# Altium footprint library IC.PcbLib: 220 footprints (part 5 of 14)
Each footprint in its own frame and in the unit in brackets; x right, y up, seen from the top. Pads: shape width x height; smd on the part's side, far side on the other; paste and mask are expansions set on the pad; w line width, h text height; cw(c..) or ccw(c..) is an arc to the next point about the centre after c.
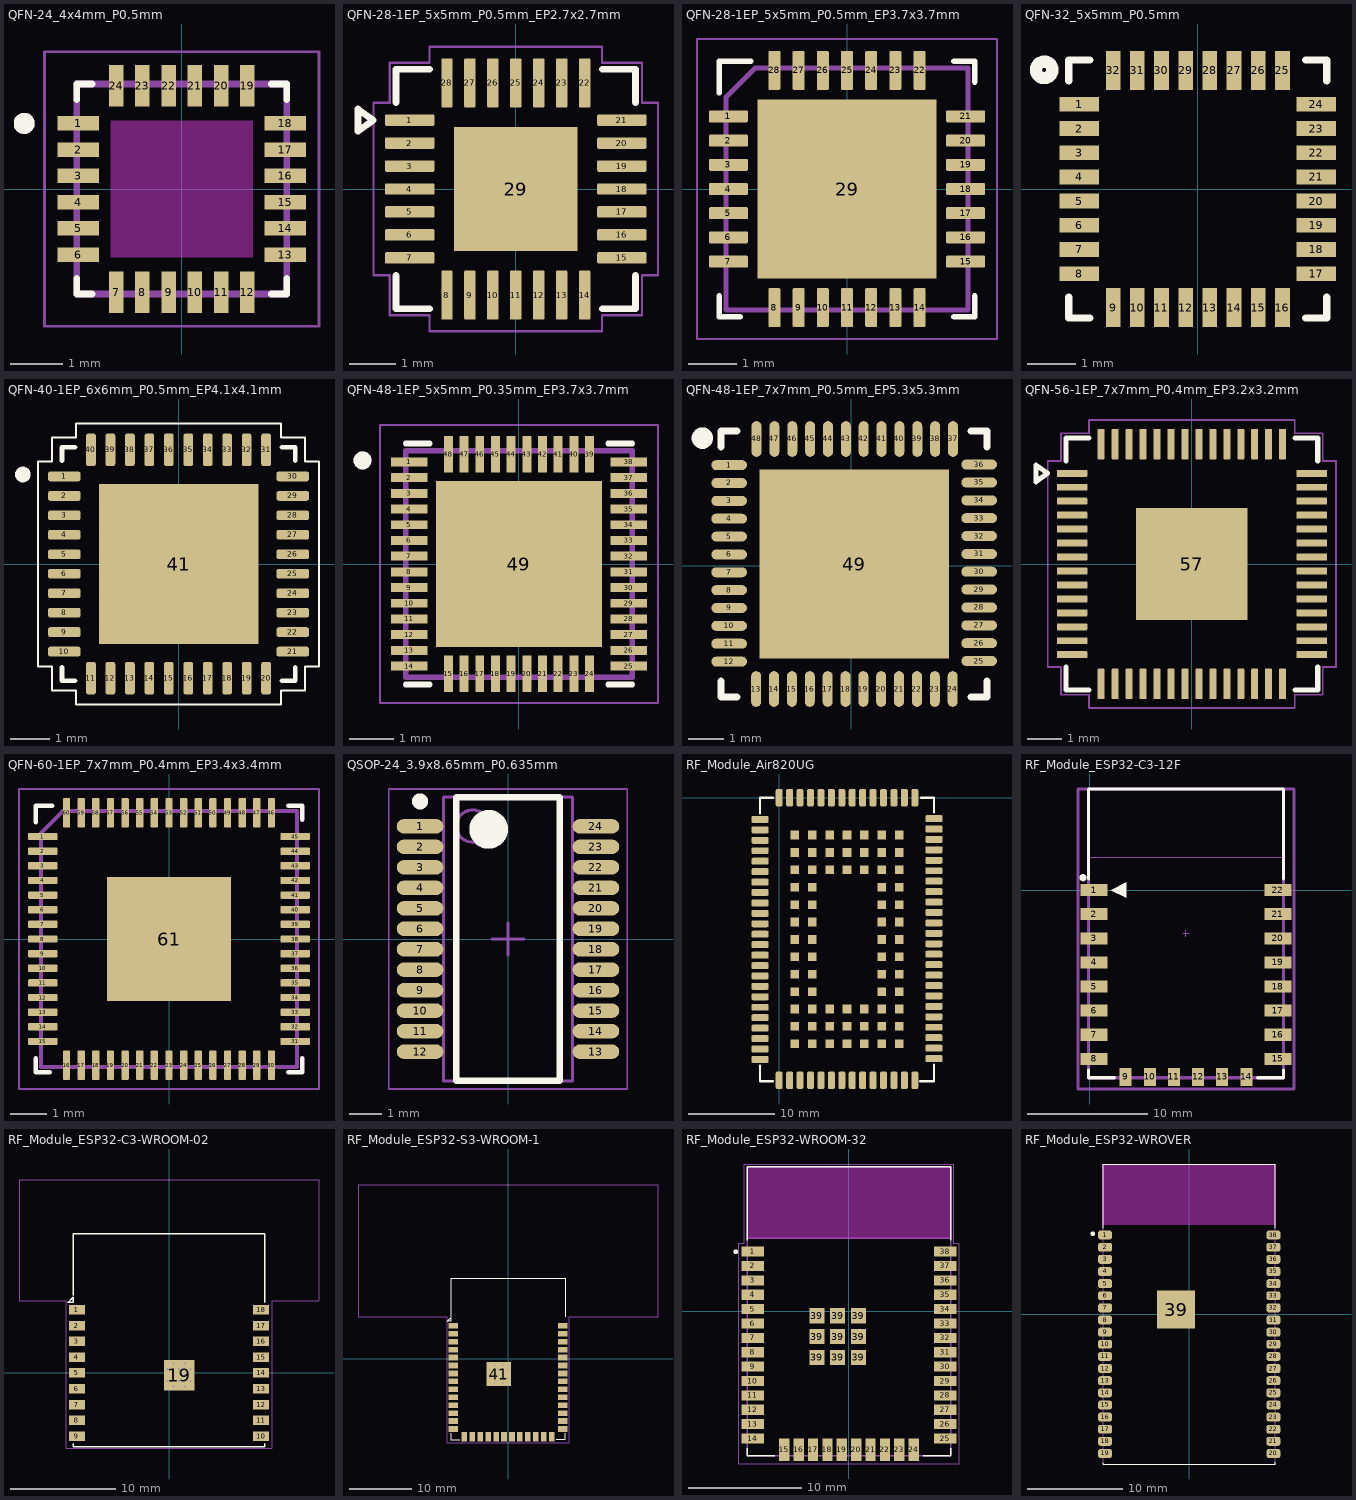
[diagram p4: the footprints below, top view; thin cyan lines are the x and y axes]

## QFN-24_4x4mm_P0.5mm [mm] "QFN-24 without exposed pad, body 4x4mm, pitch 0.5mm (MPU-6050)"
height 0.95
pads (24):
  rect 0.79x0.28 smd: 1(-1.97,1.25) 2(-1.97,0.75) 3(-1.97,0.25) 4(-1.97,-0.25) 5(-1.97,-0.75) 6(-1.97,-1.25) 13(1.97,-1.25) 14(1.97,-0.75) 15(1.97,-0.25) 16(1.97,0.25) 17(1.97,0.75) 18(1.97,1.25)
  rect 0.28x0.79 smd: 7(-1.25,-1.97) 8(-0.75,-1.97) 9(-0.25,-1.97) 10(0.25,-1.97) 11(0.75,-1.97) 12(1.25,-1.97) 19(1.25,1.97) 20(0.75,1.97) 21(0.25,1.97) 22(-0.25,1.97) 23(-0.75,1.97) 24(-1.25,1.97)
Top Overlay:
  circle w0.2: c-3,1.25 r0.1
  lines w0.127: -2,-1.705 -2,-2 -1.705,-2 ; -2,1.705 -2,2 -1.705,2 ; 1.705,-2 2,-2 2,-1.705 ; 1.705,2 2,2 2,1.705
Keep-Out Layer:
  region: 1.35,-1.3 -1.35,-1.3 -1.35,1.3 1.35,1.3
Mechanical 13:
  circle w0.2: c-3,1.25 r0.1
  lines w0.127: -2,-2 -2,2 2,2 2,-2 -2,-2
Mechanical 15:
  lines w0.05: -2.615,-2.615 -2.615,2.615 2.615,2.615 2.615,-2.615 -2.615,-2.615
3D body "step_temp.STEP": height 0.93, standoff -0.02, extent -2,-2 2,2

## QFN-28-1EP_5x5mm_P0.5mm_EP2.7x2.7mm [mm] "QFN-28 5x5mm pitch 0.5mm with exposed thermal pad 2.7x2.7mm (CP2102 / CP2102N)"
height 0.88
pads (29):
  rrect25% 1.075x0.25 smd: 1(-2.312,1.5) 2(-2.312,1) 3(-2.312,0.5) 4(-2.312,0) 5(-2.312,-0.5) 6(-2.312,-1) 7(-2.312,-1.5) 15(2.312,-1.5) 16(2.312,-1) 17(2.312,-0.5) 18(2.312,0) 19(2.312,0.5) 20(2.312,1) 21(2.312,1.5)
  rrect25% 0.25x1.075 smd: 8(-1.5,-2.312) 9(-1,-2.312) 10(-0.5,-2.312) 11(0,-2.312) 12(0.5,-2.312) 13(1,-2.312) 14(1.5,-2.312) 22(1.5,2.312) 23(1,2.312) 24(0.5,2.312) 25(0,2.312) 26(-0.5,2.312) 27(-1,2.312) 28(-1.5,2.312)
  rect 2.7x2.7 smd: 29(0,0)
Top Overlay:
  lines w0.15: -2.61,-1.885 -2.61,-2.61 -1.885,-2.61 ; -2.61,1.885 -2.61,2.61 -1.885,2.61 ; 1.885,-2.61 2.61,-2.61 2.61,-1.885 ; 1.885,2.61 2.61,2.61 2.61,1.885 ; -3.44,1.26 -3.11,1.5 -3.44,1.74 -3.44,1.26
Mechanical 4:
  lines w0.05: -3.1,-1.88 -3.1,1.88 -2.75,1.88 -2.75,2.75 -1.88,2.75 -1.88,3.1 1.88,3.1 1.88,2.75 2.75,2.75 2.75,1.88 3.1,1.88 3.1,-1.88 2.75,-1.88 2.75,-2.75 1.88,-2.75 1.88,-3.1 -1.88,-3.1 -1.88,-2.75 -2.75,-2.75 -2.75,-1.88 -3.1,-1.88
3D body "QFN-28_5x5mm.step": height 0.88, standoff 0, extent -2.55,-2.55 2.55,2.55

## QFN-28-1EP_5x5mm_P0.5mm_EP3.7x3.7mm [mm] "TMC2209-LA, Silent stepper motor driver, UART and StallGuard4 — Driver động cơ bước chạy êm, UART và dò điểm gốc StallGuard4 [Driver dong co buoc chay em, UART va do diem goc StallGuard4]"
height 0.9
pads (29):
  rrect20% 0.8x0.25 smd mask+0.03: 1(-2.45,1.5) 2(-2.45,1) 3(-2.45,0.5) 4(-2.45,0) 5(-2.45,-0.5) 6(-2.45,-1) 7(-2.45,-1.5) 15(2.45,-1.5) 16(2.45,-1) 17(2.45,-0.5) 18(2.45,0) 19(2.45,0.5) 20(2.45,1) 21(2.45,1.5)
  rrect20% 0.25x0.8 smd mask+0.03: 8(-1.5,-2.45) 9(-1,-2.45) 10(-0.5,-2.45) 11(0,-2.45) 12(0.5,-2.45) 13(1,-2.45) 14(1.5,-2.45) 22(1.5,2.45) 23(1,2.45) 24(0.5,2.45) 25(0,2.45) 26(-0.5,2.45) 27(-1,2.45) 28(-1.5,2.45)
  rect 3.7x3.7 smd paste-3.7 mask+0.03: 29(0,0)
Top Overlay:
  lines w0.12: -2.64,-2.21 -2.64,-2.64 -2.21,-2.64 ; -2.64,1.99 -2.64,2.64 -1.99,2.64 ; 2.21,-2.64 2.64,-2.64 2.64,-2.21 ; 2.21,2.64 2.64,2.64 2.64,2.21
  text ".Designator" at -2.5,3.3 h1
Top Paste:
  region: -1.67,-1.42 -1.637,-1.545 -1.545,-1.637 -1.42,-1.67 -0.43,-1.67 -0.305,-1.637 -0.213,-1.545 -0.18,-1.42 -0.18,-0.43 -0.213,-0.305 -0.305,-0.213 -0.43,-0.18 -1.42,-0.18 -1.545,-0.213 -1.637,-0.305 -1.67,-0.43
  region: -1.67,0.43 -1.637,0.305 -1.545,0.213 -1.42,0.18 -0.43,0.18 -0.305,0.213 -0.213,0.305 -0.18,0.43 -0.18,1.42 -0.213,1.545 -0.305,1.637 -0.43,1.67 -1.42,1.67 -1.545,1.637 -1.637,1.545 -1.67,1.42
  region: 0.18,-1.42 0.213,-1.545 0.305,-1.637 0.43,-1.67 1.42,-1.67 1.545,-1.637 1.637,-1.545 1.67,-1.42 1.67,-0.43 1.637,-0.305 1.545,-0.213 1.42,-0.18 0.43,-0.18 0.305,-0.213 0.213,-0.305 0.18,-0.43
  region: 0.18,0.43 0.213,0.305 0.305,0.213 0.43,0.18 1.42,0.18 1.545,0.213 1.637,0.305 1.67,0.43 1.67,1.42 1.637,1.545 1.545,1.637 1.42,1.67 0.43,1.67 0.305,1.637 0.213,1.545 0.18,1.42
Mechanical 2:
  lines w0.1: -2.5,-2.5 2.5,-2.5 2.5,2.5 -1.9,2.5 -2.5,1.9 -2.5,-2.5
Mechanical 4:
  lines w0.05: -3.1,-3.1 3.1,-3.1 3.1,3.1 -3.1,3.1 -3.1,-3.1
3D body "QFN-28-1EP_5x5mm_P0.5mm_EP3.7x3.7mm.step": height 0, standoff 0, extent -2.85,-2.85 2.85,2.85

## QFN-32_5x5mm_P0.5mm [mil] "QFN-32 without exposed pad, body 5x5mm, pitch 0.5mm"
pads (32):
  rect 32x12 smd: 1(-96.55,68.9) 2(-96.55,49.21) 3(-96.55,29.53) 4(-96.55,9.84) 5(-96.55,-9.84) 6(-96.55,-29.53) 7(-96.55,-49.21) 8(-96.55,-68.9) 17(96.55,-68.9) 18(96.55,-49.21) 19(96.55,-29.53) 20(96.55,-9.84) 21(96.55,9.84) 22(96.55,29.53) 23(96.55,49.21) 24(96.55,68.9)
  rect 12x32 smd: 9(-68.9,-96.55) 10(-49.21,-96.55) 11(-29.53,-96.55) 12(-9.84,-96.55) 13(9.84,-96.55) 14(29.53,-96.55) 15(49.21,-96.55) 16(68.9,-96.55) 25(68.9,96.55) 26(49.21,96.55) 27(29.53,96.55) 28(9.84,96.55) 29(-9.84,96.55) 30(-29.53,96.55) 31(-49.21,96.55) 32(-68.9,96.55)
Top Overlay:
  circle w10: c-125,97 r6.71
  lines w6: -105,-88 -105,-105 -88,-105 ; -105,88 -105,105 -88,105 ; 88,-105 105,-105 105,-88 ; 88,105 105,105 105,88
3D body "User Library-QFN32-1.step": height 36.92, standoff 0.31, extent -98.43,-98.44 98.43,98.44

## QFN-40-1EP_6x6mm_P0.5mm_EP4.1x4.1mm [mm] "QFN-40 with exposed pad 4.1x4.1mm, body 6x6mm, pitch 0.5mm"
pads (41):
  rrect48% 0.84x0.25 smd: 1(-2.935,2.25) 2(-2.935,1.75) 3(-2.935,1.25) 4(-2.935,0.75) 5(-2.935,0.25) 6(-2.935,-0.25) 7(-2.935,-0.75) 8(-2.935,-1.25) 9(-2.935,-1.75) 10(-2.935,-2.25) 21(2.935,-2.25) 22(2.935,-1.75) 23(2.935,-1.25) 24(2.935,-0.75) 25(2.935,-0.25) 26(2.935,0.25) 27(2.935,0.75) 28(2.935,1.25) 29(2.935,1.75) 30(2.935,2.25)
  rrect48% 0.25x0.84 smd: 11(-2.25,-2.935) 12(-1.75,-2.935) 13(-1.25,-2.935) 14(-0.75,-2.935) 15(-0.25,-2.935) 16(0.25,-2.935) 17(0.75,-2.935) 18(1.25,-2.935) 19(1.75,-2.935) 20(2.25,-2.935) 31(2.25,2.935) 32(1.75,2.935) 33(1.25,2.935) 34(0.75,2.935) 35(0.25,2.935) 36(-0.25,2.935) 37(-0.75,2.935) 38(-1.25,2.935) 39(-1.75,2.935) 40(-2.25,2.935)
  rect 4.1x4.1 smd paste-3: 41(0,0)
Top Overlay:
  circle w0.2: c-4,2.3 r0.1
  lines w0.05: -3.61,-2.63 -3.61,2.63 -3.25,2.63 -3.25,3.25 -2.63,3.25 -2.63,3.61 2.63,3.61 2.63,3.25 3.25,3.25 3.25,2.63 3.61,2.63 3.61,-2.63 3.25,-2.63 3.25,-3.25 2.63,-3.25 2.63,-3.61 -2.63,-3.61 -2.63,-3.25 -3.25,-3.25 -3.25,-2.63 -3.61,-2.63
  lines w0.127: -3,-2.66 -3,-3 -2.66,-3 ; -3,2.66 -3,3 -2.66,3 ; 2.66,-3 3,-3 3,-2.66 ; 2.66,3 3,3 3,2.66
Top Paste:
  region: 1.3,-1.303 -1.303,-1.303 -1.303,1.3 1.3,1.3
3D body "ALSRobot-QFN40 6X6.STEP": height 1.06, standoff 0.01, extent -3.075,-3 3.075,3.15

## QFN-48-1EP_5x5mm_P0.35mm_EP3.7x3.7mm [mm] "QFN-48 with exposed pad 3.7x3.7mm, body 5x5mm, pitch 0.35mm (ESP32-D2WD)"
pads (49):
  rrect5% 0.81x0.2 smd: 1(-2.445,2.275) 2(-2.445,1.925) 3(-2.445,1.575) 4(-2.445,1.225) 5(-2.445,0.875) 6(-2.445,0.525) 7(-2.445,0.175) 8(-2.445,-0.175) 9(-2.445,-0.525) 10(-2.445,-0.875) 11(-2.445,-1.225) 12(-2.445,-1.575) 13(-2.445,-1.925) 14(-2.445,-2.275) 25(2.445,-2.275) 26(2.445,-1.925) 27(2.445,-1.575) 28(2.445,-1.225) 29(2.445,-0.875) 30(2.445,-0.525) 31(2.445,-0.175) 32(2.445,0.175) 33(2.445,0.525) 34(2.445,0.875) 35(2.445,1.225) 36(2.445,1.575) 37(2.445,1.925) 38(2.445,2.275)
  rrect5% 0.2x0.81 smd: 15(-1.575,-2.445) 16(-1.225,-2.445) 17(-0.875,-2.445) 18(-0.525,-2.445) 19(-0.175,-2.445) 20(0.175,-2.445) 21(0.525,-2.445) 22(0.875,-2.445) 23(1.225,-2.445) 24(1.575,-2.445) 39(1.575,2.445) 40(1.225,2.445) 41(0.875,2.445) 42(0.525,2.445) 43(0.175,2.445) 44(-0.175,2.445) 45(-0.525,2.445) 46(-0.875,2.445) 47(-1.225,2.445) 48(-1.575,2.445)
  rect 3.7x3.7 smd paste-3: 49(0,0)
Top Overlay:
  circle w0.2: c-3.49,2.31 r0.1
  lines w0.127: -2.525,-2.689 -1.99,-2.689 ; -2.525,2.689 -1.99,2.689 ; 1.99,-2.689 2.525,-2.689 ; 1.99,2.689 2.525,2.689
Top Paste:
  region: 1.49,-1.49 0.18,-1.49 0.18,-0.18 1.49,-0.18
  region: -0.18,-1.49 -1.49,-1.49 -1.49,-0.18 -0.18,-0.18
  region: 1.49,0.18 0.18,0.18 0.18,1.49 1.49,1.49
  region: -0.18,0.18 -1.49,0.18 -1.49,1.49 -0.18,1.49
Mechanical 13:
  circle w0.2: c-3.49,2.31 r0.1
  lines w0.127: -2.525,-2.525 2.525,-2.525 2.525,2.525 -2.525,2.525 -2.525,-2.525
Mechanical 15:
  lines w0.05: -3.1,-3.1 -3.1,3.1 3.1,3.1 3.1,-3.1 -3.1,-3.1
3D body "QFN-48-1EP_5x5mm_P0.35mm_E.step": height 0.9, standoff 0, extent -2.769,-2.545 2.769,2.545

## QFN-48-1EP_7x7mm_P0.5mm_EP5.3x5.3mm [mm] "QFN-48 with exposed pad 5.3x5.3mm, body 7x7mm, pitch 0.5mm"
pads (49):
  oval 1x0.28 smd: 1(-3.424,2.82) 2(-3.424,2.319) 3(-3.424,1.819) 4(-3.424,1.318) 5(-3.424,0.818) 6(-3.424,0.318) 7(-3.424,-0.18) 8(-3.424,-0.681) 9(-3.424,-1.181) 10(-3.424,-1.681) 11(-3.424,-2.182) 12(-3.424,-2.682) 25(3.576,-2.667) 26(3.576,-2.166) 27(3.576,-1.666) 28(3.576,-1.166) 29(3.576,-0.665) 30(3.576,-0.165) 31(3.576,0.333) 32(3.576,0.833) 33(3.576,1.334) 34(3.576,1.834) 35(3.576,2.334) 36(3.576,2.835)
  oval 0.28x1 smd: 13(-2.667,-3.449) 14(-2.166,-3.449) 15(-1.666,-3.449) 16(-1.166,-3.449) 17(-0.665,-3.449) 18(-0.165,-3.449) 19(0.333,-3.449) 20(0.833,-3.449) 21(1.334,-3.449) 22(1.834,-3.449) 23(2.334,-3.449) 24(2.835,-3.449) 37(2.845,3.551) 38(2.345,3.551) 39(1.844,3.551) 40(1.344,3.551) 41(0.843,3.551) 42(0.343,3.551) 43(-0.155,3.551) 44(-0.655,3.551) 45(-1.156,3.551) 46(-1.656,3.551) 47(-2.156,3.551) 48(-2.657,3.551)
  rect 5.3x5.3 smd: 49(0.076,0.051)
Top Overlay:
  lines w0.2: -3.649,-3.224 -3.649,-3.674 -3.199,-3.674 ; -3.649,3.326 -3.649,3.776 -3.199,3.776 ; 3.351,-3.674 3.801,-3.674 3.801,-3.224 ; 3.351,3.776 3.801,3.776 3.801,3.326
  lines w0.3: -4.023,3.574 cw(c-4.173,3.575) -4.023,3.576
3D body "QFN127P600-8N.step": height 0.75, standoff 0, extent -3.499,-3.524 3.651,3.626

## QFN-56-1EP_7x7mm_P0.4mm_EP3.2x3.2mm [mm] "QFN-56 7x7mm pitch 0.4mm with exposed GND pad (Raspberry Pi RP2040)"
height 0.9
pads (57):
  rrect25% 0.875x0.2 smd: 1(-3.437,2.6) 2(-3.437,2.2) 3(-3.437,1.8) 4(-3.437,1.4) 5(-3.437,1) 6(-3.437,0.6) 7(-3.437,0.2) 8(-3.437,-0.2) 9(-3.437,-0.6) 10(-3.437,-1) 11(-3.437,-1.4) 12(-3.437,-1.8) 13(-3.437,-2.2) 14(-3.437,-2.6) 29(3.437,-2.6) 30(3.437,-2.2) 31(3.437,-1.8) 32(3.437,-1.4) 33(3.437,-1) 34(3.437,-0.6) 35(3.437,-0.2) 36(3.437,0.2) 37(3.437,0.6) 38(3.437,1) 39(3.437,1.4) 40(3.437,1.8) 41(3.437,2.2) 42(3.437,2.6)
  rrect25% 0.2x0.875 smd: 15(-2.6,-3.437) 16(-2.2,-3.437) 17(-1.8,-3.437) 18(-1.4,-3.437) 19(-1,-3.437) 20(-0.6,-3.437) 21(-0.2,-3.437) 22(0.2,-3.437) 23(0.6,-3.437) 24(1,-3.437) 25(1.4,-3.437) 26(1.8,-3.437) 27(2.2,-3.437) 28(2.6,-3.437) 43(2.6,3.437) 44(2.2,3.437) 45(1.8,3.437) 46(1.4,3.437) 47(1,3.437) 48(0.6,3.437) 49(0.2,3.437) 50(-0.2,3.437) 51(-0.6,3.437) 52(-1,3.437) 53(-1.4,3.437) 54(-1.8,3.437) 55(-2.2,3.437) 56(-2.6,3.437)
  rect 3.2x3.2 smd: 57(0,0)
Top Overlay:
  lines w0.15: -3.61,-2.96 -3.61,-3.61 -2.96,-3.61 ; -3.61,2.96 -3.61,3.61 -2.96,3.61 ; 2.96,-3.61 3.61,-3.61 3.61,-2.96 ; 2.96,3.61 3.61,3.61 3.61,2.96 ; -4.47,2.36 -4.14,2.6 -4.47,2.84 -4.47,2.36
Mechanical 4:
  lines w0.05: -4.13,-2.95 -4.13,2.95 -3.75,2.95 -3.75,3.75 -2.95,3.75 -2.95,4.13 2.95,4.13 2.95,3.75 3.75,3.75 3.75,2.95 4.13,2.95 4.13,-2.95 3.75,-2.95 3.75,-3.75 2.95,-3.75 2.95,-4.13 -2.95,-4.13 -2.95,-3.75 -3.75,-3.75 -3.75,-2.95 -4.13,-2.95
3D body "QFN-56-1EP_7x7mm_P0.4mm_EP3.2x3.2mm.step": height 0.9, standoff 0, extent -3.5,-3.5 3.5,3.5

## QFN-60-1EP_7x7mm_P0.4mm_EP3.4x3.4mm [mm] "RP2350A, Dual-core Cortex-M33 or Hazard3 RISC-V MCU, 30 GPIO — Vi điều khiển hai lõi Cortex-M33 hoặc Hazard3 RISC-V, 30 GPIO [Vi dieu khien hai loi Cortex-M33 hoac Hazard3 RISC-V, 30 GPIO]"
height 0.9
pads (61):
  rrect25% 0.8x0.2 smd mask+0.03: 1(-3.45,2.8) 2(-3.45,2.4) 3(-3.45,2) 4(-3.45,1.6) 5(-3.45,1.2) 6(-3.45,0.8) 7(-3.45,0.4) 8(-3.45,0) 9(-3.45,-0.4) 10(-3.45,-0.8) 11(-3.45,-1.2) 12(-3.45,-1.6) 13(-3.45,-2) 14(-3.45,-2.4) 15(-3.45,-2.8) 31(3.45,-2.8) 32(3.45,-2.4) 33(3.45,-2) 34(3.45,-1.6) 35(3.45,-1.2) 36(3.45,-0.8) 37(3.45,-0.4) 38(3.45,0) 39(3.45,0.4) 40(3.45,0.8) 41(3.45,1.2) 42(3.45,1.6) 43(3.45,2) 44(3.45,2.4) 45(3.45,2.8)
  rrect25% 0.2x0.8 smd mask+0.03: 16(-2.8,-3.45) 17(-2.4,-3.45) 18(-2,-3.45) 19(-1.6,-3.45) 20(-1.2,-3.45) 21(-0.8,-3.45) 22(-0.4,-3.45) 23(0,-3.45) 24(0.4,-3.45) 25(0.8,-3.45) 26(1.2,-3.45) 27(1.6,-3.45) 28(2,-3.45) 29(2.4,-3.45) 30(2.8,-3.45) 46(2.8,3.45) 47(2.4,3.45) 48(2,3.45) 49(1.6,3.45) 50(1.2,3.45) 51(0.8,3.45) 52(0.4,3.45) 53(0,3.45) 54(-0.4,3.45) 55(-0.8,3.45) 56(-1.2,3.45) 57(-1.6,3.45) 58(-2,3.45) 59(-2.4,3.45) 60(-2.8,3.45)
  rect 3.4x3.4 smd paste-3.4 mask+0.03: 61(0,0)
Top Overlay:
  lines w0.12: -3.64,-3.26 -3.64,-3.64 -3.26,-3.64 ; -3.64,3.19 -3.64,3.64 -3.19,3.64 ; 3.26,-3.64 3.64,-3.64 3.64,-3.26 ; 3.26,3.64 3.64,3.64 3.64,3.26
  text ".Designator" at -3.5,4.3 h1
Top Paste:
  region: -1.585,-1.358 -1.555,-1.471 -1.471,-1.555 -1.358,-1.585 -0.903,-1.585 -0.789,-1.555 -0.705,-1.471 -0.675,-1.358 -0.675,-0.903 -0.705,-0.789 -0.789,-0.705 -0.903,-0.675 -1.358,-0.675 -1.471,-0.705 -1.555,-0.789 -1.585,-0.903
  region: -1.585,-0.228 -1.555,-0.341 -1.471,-0.425 -1.358,-0.455 -0.903,-0.455 -0.789,-0.425 -0.705,-0.341 -0.675,-0.228 -0.675,0.228 -0.705,0.341 -0.789,0.425 -0.903,0.455 -1.358,0.455 -1.471,0.425 -1.555,0.341 -1.585,0.228
  region: -1.585,0.903 -1.555,0.789 -1.471,0.705 -1.358,0.675 -0.903,0.675 -0.789,0.705 -0.705,0.789 -0.675,0.903 -0.675,1.358 -0.705,1.471 -0.789,1.555 -0.903,1.585 -1.358,1.585 -1.471,1.555 -1.555,1.471 -1.585,1.358
  region: -0.455,-1.358 -0.425,-1.471 -0.341,-1.555 -0.228,-1.585 0.228,-1.585 0.341,-1.555 0.425,-1.471 0.455,-1.358 0.455,-0.903 0.425,-0.789 0.341,-0.705 0.228,-0.675 -0.228,-0.675 -0.341,-0.705 -0.425,-0.789 -0.455,-0.903
  region: -0.455,-0.228 -0.425,-0.341 -0.341,-0.425 -0.228,-0.455 0.228,-0.455 0.341,-0.425 0.425,-0.341 0.455,-0.228 0.455,0.228 0.425,0.341 0.341,0.425 0.228,0.455 -0.228,0.455 -0.341,0.425 -0.425,0.341 -0.455,0.228
  region: -0.455,0.903 -0.425,0.789 -0.341,0.705 -0.228,0.675 0.228,0.675 0.341,0.705 0.425,0.789 0.455,0.903 0.455,1.358 0.425,1.471 0.341,1.555 0.228,1.585 -0.228,1.585 -0.341,1.555 -0.425,1.471 -0.455,1.358
  region: 0.675,-1.358 0.705,-1.471 0.789,-1.555 0.903,-1.585 1.358,-1.585 1.471,-1.555 1.555,-1.471 1.585,-1.358 1.585,-0.903 1.555,-0.789 1.471,-0.705 1.358,-0.675 0.903,-0.675 0.789,-0.705 0.705,-0.789 0.675,-0.903
  region: 0.675,-0.228 0.705,-0.341 0.789,-0.425 0.903,-0.455 1.358,-0.455 1.471,-0.425 1.555,-0.341 1.585,-0.228 1.585,0.228 1.555,0.341 1.471,0.425 1.358,0.455 0.903,0.455 0.789,0.425 0.705,0.341 0.675,0.228
  region: 0.675,0.903 0.705,0.789 0.789,0.705 0.903,0.675 1.358,0.675 1.471,0.705 1.555,0.789 1.585,0.903 1.585,1.358 1.555,1.471 1.471,1.555 1.358,1.585 0.903,1.585 0.789,1.555 0.705,1.471 0.675,1.358
Mechanical 2:
  lines w0.1: -3.5,-3.5 3.5,-3.5 3.5,3.5 -2.9,3.5 -3.5,2.9 -3.5,-3.5
Mechanical 4:
  lines w0.05: -4.1,-4.1 4.1,-4.1 4.1,4.1 -4.1,4.1 -4.1,-4.1
3D body "QFN-60-1EP_7x7mm_P0.4mm_EP3.4x3.4mm.step": height 0, standoff 0, extent -3.85,-3.85 3.85,3.85

## QSOP-24_3.9x8.65mm_P0.635mm [mm] "QSOP-24 / SSOP-24, body 3.9x8.65mm, pitch 0.635mm"
height 1.75
pads (24):
  oval 1.45x0.45 smd: 1(-2.725,3.492) 2(-2.725,2.857) 3(-2.725,2.222) 4(-2.725,1.587) 5(-2.725,0.953) 6(-2.725,0.318) 7(-2.725,-0.318) 8(-2.725,-0.953) 9(-2.725,-1.587) 10(-2.725,-2.222) 11(-2.725,-2.857) 12(-2.725,-3.492) 13(2.725,-3.492) 14(2.725,-2.857) 15(2.725,-2.222) 16(2.725,-1.587) 17(2.725,-0.953) 18(2.725,-0.318) 19(2.725,0.318) 20(2.725,0.953) 21(2.725,1.587) 22(2.725,2.222) 23(2.725,2.857) 24(2.725,3.492)
Top Overlay:
  circle w0.25: c-2.725,4.267 r0.125
  circle w0.6: c-0.6,3.4 r0.3
  lines w0.2: -1.6,-4.4 -1.6,4.4 1.6,4.4 1.6,-4.4 -1.6,-4.4
Mechanical 13:
  circle w0.1: c-1.1,3.5 r0.5
  lines w0.1: -2,-4.4 -2,4.4 2,4.4 2,-4.4 -2,-4.4
Mechanical 15:
  lines w0.05: -3.7,-4.65 -3.7,4.65 3.7,4.65 3.7,-4.65 -3.7,-4.65
  lines w0.1: -0.5,0 0.5,0 ; 0,-0.5 0,0.5
3D body "User Library-QSOP24-2.STEP": height 1.61, standoff 0.01, extent -3.062,-4.332 2.921,4.318

## RF_Module_Air820UG [mm] "Luat Air820UG 4G Cat.1 LTE module, 146 pads, pitch 1.2mm"
pads (146):
  rrect50% 2x0.8 smd: 1(-2.2,-2.5) 2(-2.2,-3.7) 3(-2.2,-4.9) 4(-2.2,-6.1) 5(-2.2,-7.3) 6(-2.2,-8.5) 7(-2.2,-9.7) 8(-2.2,-10.9) 9(-2.2,-12.1) 10(-2.2,-13.3) 11(-2.2,-14.5) 12(-2.2,-15.7) 13(-2.2,-16.9) 14(-2.2,-18.1) 15(-2.2,-19.3) 16(-2.2,-20.5) 17(-2.2,-21.7) 18(-2.2,-22.9) 19(-2.2,-24.1) 20(-2.2,-25.3) 21(-2.2,-26.5) 22(-2.2,-27.7) 23(-2.2,-28.9) 24(-2.2,-30.1) 39(17.8,-30) 40(17.8,-28.8) 41(17.8,-27.6) 42(17.8,-26.4) 43(17.8,-25.2) 44(17.8,-24) 45(17.8,-22.8) 46(17.8,-21.6) 47(17.8,-20.4) 48(17.8,-19.2) 49(17.8,-18) 50(17.8,-16.8) 51(17.8,-15.6) 52(17.8,-14.4) 53(17.8,-13.2) 54(17.8,-12) 55(17.8,-10.8) 56(17.8,-9.6) 57(17.8,-8.4) 58(17.8,-7.2) 59(17.8,-6) 60(17.8,-4.8) 61(17.8,-3.6) 62(17.8,-2.4)
  rrect50% 0.8x2 smd: 25(0,-32.5) 26(1.2,-32.5) 27(2.4,-32.5) 28(3.6,-32.5) 29(4.8,-32.5) 30(6,-32.5) 31(7.2,-32.5) 32(8.4,-32.5) 33(9.6,-32.5) 34(10.8,-32.5) 35(12,-32.5) 36(13.2,-32.5) 37(14.4,-32.5) 38(15.6,-32.5) 63(15.6,0) 64(14.4,0) 65(13.2,0) 66(12,0) 67(10.8,0) 68(9.6,0) 69(8.4,0) 70(7.2,0) 71(6,0) 72(4.8,0) 73(3.6,0) 74(2.4,0) 75(1.2,0) 76(0,0)
  rect 1x1 smd: 77(1.8,-4.3) 78(3.8,-4.3) 79(5.8,-4.3) 80(7.8,-4.3) 81(9.8,-4.3) 82(11.8,-4.3) 83(13.8,-4.3) 84(1.8,-6.3) 85(3.8,-6.3) 86(5.8,-6.3) 87(7.8,-6.3) 88(9.8,-6.3) 89(11.8,-6.3) 90(13.8,-6.3) 91(1.8,-8.3) 92(3.8,-8.3) 93(5.8,-8.3) 94(7.8,-8.3) 95(9.8,-8.3) 96(11.8,-8.3) 97(13.8,-8.3) 98(1.8,-10.3) 99(3.8,-10.3) 100(11.8,-10.3) 101(13.8,-10.3) 102(1.8,-12.3) 103(3.8,-12.3) 104(11.8,-12.3) 105(13.8,-12.3) 106(1.8,-14.3) 107(3.8,-14.3) 108(11.8,-14.3) 109(13.8,-14.3) 110(1.8,-16.3) 111(3.8,-16.3) 112(11.8,-16.3) 113(13.8,-16.3) 114(1.8,-18.3) 115(3.8,-18.3) 116(11.8,-18.3) 117(13.8,-18.3) 118(1.8,-20.3) 119(3.8,-20.3) 120(11.8,-20.3) 121(13.8,-20.3) 122(1.8,-22.3) 123(3.8,-22.3) 124(11.8,-22.3) 125(13.8,-22.3) 126(1.8,-24.3) 127(3.8,-24.3) 128(5.8,-24.3) 129(7.8,-24.3) 130(9.8,-24.3) 131(11.8,-24.3) 132(13.8,-24.3) 133(1.8,-26.3) 134(3.8,-26.3) 135(5.8,-26.3) 136(7.8,-26.3) 137(9.8,-26.3) 138(11.8,-26.3) 139(13.8,-26.3) 140(1.8,-28.3) 141(3.8,-28.3) 142(5.8,-28.3) 143(7.8,-28.3) 144(9.8,-28.3) 145(11.8,-28.3) 146(13.8,-28.3)
Top Overlay:
  lines w0.254: -2.2,-30.8 -2.2,-32.6 -0.7,-32.6 ; -2.2,-1.8 -2.2,0 -0.7,0 ; 16.2,-32.6 17.8,-32.6 17.8,-30.7 ; 16.3,0 17.8,0 17.8,-1.7
3D body "RF_Module_Air820UG.step": height 2.35, standoff 0, extent -1.9,-32.3 17.5,0

## RF_Module_ESP32-C3-12F [mm] "Ai-Thinker ESP32-C3-12F Wi-Fi/BLE module, 22 pads, pitch 2.0mm"
height 3.2
pads (22):
  rect 2.25x1 smd: 1(0.375,0) 2(0.375,-2) 3(0.375,-4) 4(0.375,-6) 5(0.375,-8) 6(0.375,-10) 7(0.375,-12) 8(0.375,-14) 15(15.625,-14) 16(15.625,-12) 17(15.625,-10) 18(15.625,-8) 19(15.625,-6) 20(15.625,-4) 21(15.625,-2) 22(15.625,0)
  rect 1x1.5 smd: 9(3,-15.5) 10(5,-15.5) 11(7,-15.5) 12(9,-15.5) 13(11,-15.5) 14(13,-15.5)
Top Overlay:
  circle w0.3: c-0.55,1.025 r0.15
  region: 1.77,0 3.04,-0.635 3.04,0.635
  lines w0.254: -0.084,-14.916 -0.084,-15.568 2.068,-15.568 ; -0.084,0.916 -0.084,8.371 16.084,8.371 16.084,0.916 ; 13.932,-15.568 16.084,-15.568 16.084,-14.916
Mechanical 13:
  lines w0.051: -0.127,2.727 -0.127,8.382 16.129,8.382 16.129,2.727 -0.127,2.727
  lines w0.254: -0.084,-15.568 16.084,-15.568 16.084,8.371 -0.084,8.371 -0.084,-15.568
  text "CUTOUT POLYGON" at 0.127,7.366 h0.25
  text "ANTENNA AREA" at 0.127,7.874 h0.25
Mechanical 15:
  lines w0.1: 7.746,-3.598 8.254,-3.598 ; 8,-3.852 8,-3.344
  lines w0.254: -0.975,-16.5 -0.975,8.371 16.975,8.371 16.975,-16.5 -0.975,-16.5
3D body "ESP_12_E.STEP": height 2.75, standoff 0.04, extent 0.001,-15.491 16.001,8.509

## RF_Module_ESP32-C3-WROOM-02 [mm] "Espressif ESP32-C3-WROOM-02 RISC-V Wi-Fi + BLE 5.0 module (19 pins)"
height 3.2
pads (31):
  rect 1.5x0.9 smd: 1(-8.75,6) 2(-8.75,4.5) 3(-8.75,3) 4(-8.75,1.5) 5(-8.75,0) 6(-8.75,-1.5) 7(-8.75,-3) 8(-8.75,-4.5) 9(-8.75,-6) 10(8.75,-6) 11(8.75,-4.5) 12(8.75,-3) 13(8.75,-1.5) 14(8.75,0) 15(8.75,1.5) 16(8.75,3) 17(8.75,4.5) 18(8.75,6)
  round 0.6 hole 0.2: 19(-0.14,-0.75) 19(-0.14,0.35) 19(0.41,-1.3) 19(0.41,-0.2) 19(0.41,0.9) 19(0.96,-0.75) 19(0.96,0.35) 19(1.51,-1.3) 19(1.51,-0.2) 19(1.51,0.9) 19(2.06,-0.75) 19(2.06,0.35)
  rect 2.9x2.9 smd: 19(0.96,-0.2)
Top Overlay:
  lines w0.15: -9.11,-6.71 -9.11,-7.01 9.11,-7.01 9.11,-6.71 ; -9.11,7.4 -9.11,13.21 9.11,13.21 9.11,6.71 ; -9.6,6.7 -9.1,6.7 -9.1,7.2 -9.6,6.7
Mechanical 4:
  lines w0.05: -14.25,6.85 -14.25,18.35 14.25,18.35 14.25,6.85 9.75,6.85 9.75,-7.15 -9.75,-7.15 -9.75,6.85 -14.25,6.85
3D body "ESP32-C3-WROOM-02.step": height 3.2, standoff -0.04, extent -9,-6.9 9,13.1

## RF_Module_ESP32-S3-WROOM-1 [mm] "Espressif ESP32-S3-WROOM-1 Dual-Core Wi-Fi + BLE 5.0 MCU module (41 pins)"
height 3.1
pads (53):
  rect 1.5x0.9 smd: 1(-8.75,5.26) 2(-8.75,3.99) 3(-8.75,2.72) 4(-8.75,1.45) 5(-8.75,0.18) 6(-8.75,-1.09) 7(-8.75,-2.36) 8(-8.75,-3.63) 9(-8.75,-4.9) 10(-8.75,-6.17) 11(-8.75,-7.44) 12(-8.75,-8.71) 13(-8.75,-9.98) 14(-8.75,-11.25) 27(8.75,-11.25) 28(8.75,-9.98) 29(8.75,-8.71) 30(8.75,-7.44) 31(8.75,-6.17) 32(8.75,-4.9) 33(8.75,-3.63) 34(8.75,-2.36) 35(8.75,-1.09) 36(8.75,0.18) 37(8.75,1.45) 38(8.75,2.72) 39(8.75,3.99) 40(8.75,5.26)
  rect 0.9x1.5 smd: 15(-6.985,-12.5) 16(-5.715,-12.5) 17(-4.445,-12.5) 18(-3.175,-12.5) 19(-1.905,-12.5) 20(-0.635,-12.5) 21(0.635,-12.5) 22(1.905,-12.5) 23(3.175,-12.5) 24(4.445,-12.5) 25(5.715,-12.5) 26(6.985,-12.5)
  round 0.6 hole 0.2: 41(-2.9,-3.16) 41(-2.9,-1.76) 41(-2.2,-3.86) 41(-2.2,-2.46) 41(-2.2,-1.06) 41(-1.5,-3.16) 41(-1.5,-1.76) 41(-0.8,-3.86) 41(-0.8,-2.46) 41(-0.8,-1.06) 41(-0.1,-3.16) 41(-0.1,-1.76)
  rect 3.9x3.9 smd: 41(-1.5,-2.46)
Top Overlay:
  lines w0.15: -9.2,-11.95 -9.2,-12.95 -7.7,-12.95 ; -9.2,6.7 -9.2,12.9 9.2,12.9 9.2,6.7 ; 7.7,-12.95 9.2,-12.95 9.2,-11.95 ; -9.7,6.025 -9.2,6.025 -9.2,6.525 -9.7,6.025
Mechanical 4:
  lines w0.05: -24,6.75 -24,27.75 24,27.75 24,6.75 9.75,6.75 9.75,-13.45 -9.75,-13.45 -9.75,6.75 -24,6.75
3D body "ESP32-S3-WROOM-1.step": height 3.1, standoff 0, extent -9,-12.75 9,12.75

## RF_Module_ESP32-WROOM-32 [mm] "Espressif ESP32-WROOM-32/32D Wi-Fi/BT module, pitch 1.27mm"
pads (47):
  rect 2x0.9 smd: 1(-8.5,5.26) 2(-8.5,3.99) 3(-8.5,2.72) 4(-8.5,1.45) 5(-8.5,0.18) 6(-8.5,-1.09) 7(-8.5,-2.36) 8(-8.5,-3.63) 9(-8.5,-4.9) 10(-8.5,-6.17) 11(-8.5,-7.44) 12(-8.5,-8.71) 13(-8.5,-9.98) 14(-8.5,-11.25) 25(8.5,-11.25) 26(8.5,-9.98) 27(8.5,-8.71) 28(8.5,-7.44) 29(8.5,-6.17) 30(8.5,-4.9) 31(8.5,-3.63) 32(8.5,-2.36) 33(8.5,-1.09) 34(8.5,0.18) 35(8.5,1.45) 36(8.5,2.72) 37(8.5,3.99) 38(8.5,5.26)
  rect 0.9x2 smd: 15(-5.715,-12.25) 16(-4.445,-12.25) 17(-3.175,-12.25) 18(-1.905,-12.25) 19(-0.635,-12.25) 20(0.635,-12.25) 21(1.905,-12.25) 22(3.175,-12.25) 23(4.445,-12.25) 24(5.715,-12.25)
  rect 1.33x1.33 smd: 39(-2.835,-4.075) 39(-2.835,-2.24) 39(-2.835,-0.405) 39(-1,-4.075) 39(-1,-2.24) 39(-1,-0.405) 39(0.835,-4.075) 39(0.835,-2.24) 39(0.835,-0.405)
Top Overlay:
  circle w0.2: c-10,5.25 r0.1
  lines w0.127: -9,-12.1 -9,-12.75 -6.55,-12.75 ; -9,6.25 -9,12.75 9,12.75 9,6.25 ; 6.55,-12.75 9,-12.75 9,-12.1
Keep-Out Layer:
  region: 9,6.45 -9,6.45 -9,12.75 9,12.75
  region: 9,6.45 -9,6.45 -9,12.75 9,12.75
Mechanical 13:
  circle w0.2: c-10,5.25 r0.1
  lines w0.127: -9,6.45 9,6.45 ; -9,6.45 -9,12.75 9,12.75 9,6.45 ; -9,6.45 -9,-12.75 9,-12.75 9,6.45
  text "ANTENNA" at -6,9 h1.78
Mechanical 15:
  lines w0.05: -9.75,-13.5 -9.75,6 -9.25,6 -9.25,13 9.25,13 9.25,6 9.75,6 9.75,-13.5 -9.75,-13.5
3D body "ESP32-WROOM-32.STEP": height 3.2, standoff 0, extent -9,-12.623 9,12.877

## RF_Module_ESP32-WROVER [mm] "Espressif ESP32-WROVER Wi-Fi/BT module with PSRAM, pitch 1.27mm"
pads (39):
  rrect50% 1.45x0.93 smd: 1(-8.81,8.26) 2(-8.81,6.99) 3(-8.81,5.72) 4(-8.81,4.45) 5(-8.81,3.18) 6(-8.81,1.91) 7(-8.81,0.64) 8(-8.81,-0.63) 9(-8.81,-1.9) 10(-8.81,-3.17) 11(-8.81,-4.44) 12(-8.81,-5.71) 13(-8.81,-6.98) 14(-8.81,-8.25) 15(-8.81,-9.52) 16(-8.81,-10.79) 17(-8.81,-12.06) 18(-8.81,-13.33) 19(-8.81,-14.6) 20(8.81,-14.6) 21(8.81,-13.33) 22(8.81,-12.06) 23(8.81,-10.79) 24(8.81,-9.52) 25(8.81,-8.25) 26(8.81,-6.98) 27(8.81,-5.71) 28(8.81,-4.44) 29(8.81,-3.17) 30(8.81,-1.9) 31(8.81,-0.63) 32(8.81,0.64) 33(8.81,1.91) 34(8.81,3.18) 35(8.81,4.45) 36(8.81,5.72) 37(8.81,6.99) 38(8.81,8.26)
  rect 4x4 smd paste-3: 39(-1.38,0.47)
Top Overlay:
  circle w0.24: c-10.1,8.4 r0.12
  lines w0.127: -9,-15.55 -9,-15.7 9,-15.7 9,-15.5 ; -9,8.95 -9,15.7 9,15.7 9,8.95
Top Paste:
  region: -0.115,-0.796 -2.648,-0.796 -2.648,1.735 -0.115,1.735
Keep-Out Layer:
  region: 9,9.324 -9.023,9.324 -9.023,15.7 9,15.7
  region: 9,9.331 -9.03,9.331 -9.03,15.7 9,15.7
  region: 9,9.33 -9.029,9.33 -9.029,15.7 9,15.7
Mechanical 13:
  lines w0.127: -9,-15.7 9,-15.7 9,15.7 -9,15.7 -9,-15.7
3D body "ESP32-WROVER-I--3DModel-STEP-56544.STEP": height 3.65, standoff 0, extent -9.011,-15.7 8.988,15.7